# Altium footprint library Cty1.PcbLib: 869 footprints (part 5 of 55)
Each footprint in its own frame and in the unit in brackets; x right, y up, seen from the top. Pads: shape width x height; smd on the part's side, far side on the other; paste and mask are expansions set on the pad; w line width, h text height; cw(c..) or ccw(c..) is an arc to the next point about the centre after c.
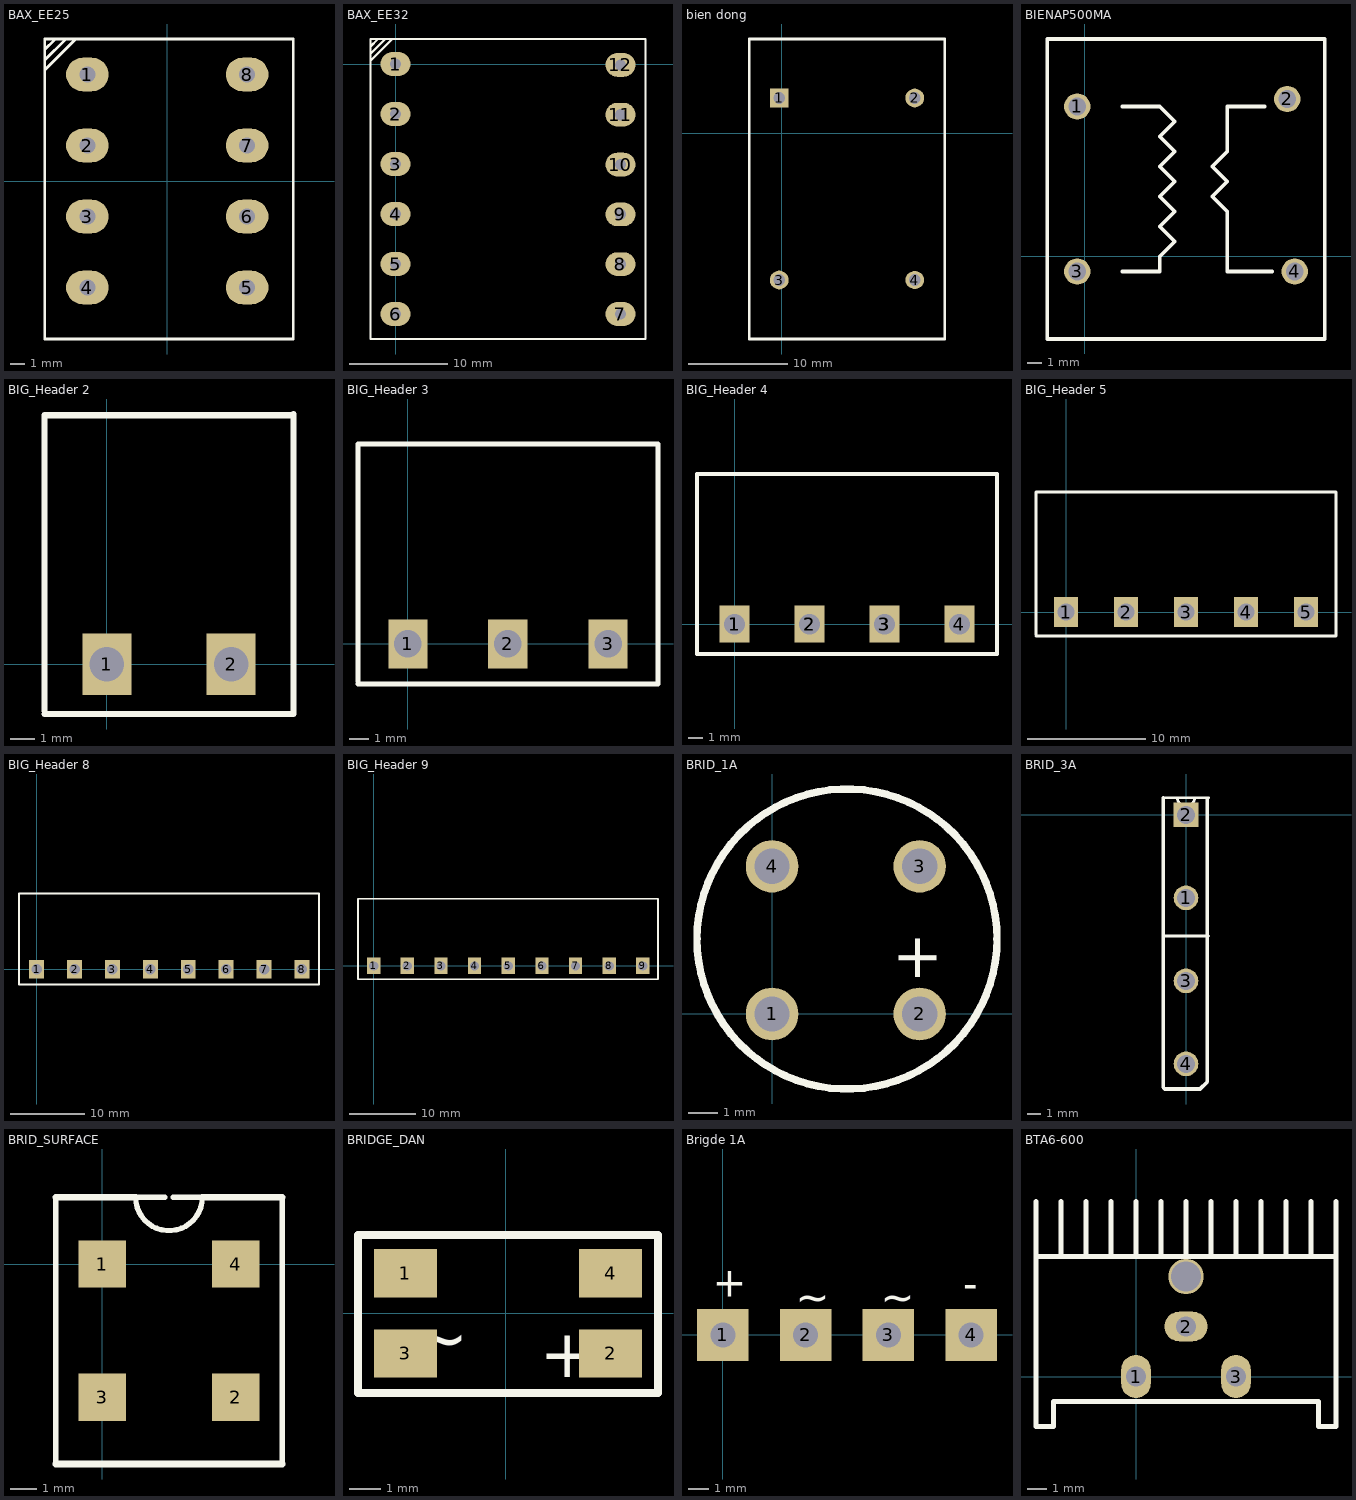
[diagram p4: the footprints below, top view; thin cyan lines are the x and y axes]

## BAX_EE25 [mil] "EE25"
pads (8):
  oval 120x95 hole 45: 1(-225,300) 2(-225,100) 3(-225,-100) 4(-225,-300) 5(225,-300) 6(225,-100) 7(225,100) 8(225,300)
Top Overlay:
  lines w8: -345,313 -259,399 ; -345,339 -345,341 -287,399 ; -345,368 -345,370 -316,399 ; -345,-445 -345,400 355,400 355,-445 -345,-445

## BAX_EE32 [mil] "EE32"
pads (12):
  oval 120x95 hole 45: 1(0,0) 2(0,-200) 3(0,-400) 4(0,-600) 5(0,-800) 6(0,-1000) 7(900,-1000) 8(900,-800.71) 9(900,-601.43) 10(900,-402.14) 11(900,-202.86) 12(900,-3.57)
Top Overlay:
  lines w8: -100,13 -14,99 ; -100,39 -100,41 -42,99 ; -100,68 -100,70 -71,99 ; -100,-1100 -100,100 1000,100 1000,-1100 -100,-1100

## bien dong [mm] "4 pin"
height 100
pads (4):
  rect 1.9x1.9 hole 1.2: 1(-0.254,3.556)
  round 1.9 hole 1.2: 2(13.462,3.556) 3(-0.254,-14.859)
  oval 1.9x1.79 hole 1.2: 4(13.462,-14.859)
Top Overlay:
  lines w0.254: -3.302,-20.828 16.51,-20.828 ; -3.302,-20.828 16.51,-20.828 ; -3.302,-20.828 -3.302,-20.32 -3.302,-19.685 -3.302,9.525 16.51,9.525 16.51,-20.828

## BIENAP500MA [mil]
pads (4):
  round 70 hole 47.24 unplated: 1(-20,400) 2(540,420) 3(-20,-40) 4(560,-40)
Top Overlay:
  lines w10: 100,-40 200,-40 200,0 240,40 200,80 240,120 200,160 240,200 200,240 240,280 200,320 240,360 200,400 100,400 ; 480,400 380,400 380,280 340,240 380,200 340,160 380,120 380,-40 500,-40 ; -100,-220 -100,580 640,580 640,-220 -100,-220

## BIG_Header 2 [mm]
pads (2):
  rect 2x2.5 hole 1.4: 1(0,0) 2(5.08,0)
Top Overlay:
  lines w0.254: -2.54,-2.032 7.62,-2.032 7.62,10.211 ; -2.54,-1.905 -2.54,10.173 ; -2.54,10.16 7.62,10.16
3D body: height 3.15, standoff -9.32, extent -2.5,-1.75 2.5,10.25
3D body: height 3.15, standoff -9.32, extent 2.58,-1.75 7.58,10.25

## BIG_Header 3 [mm]
pads (3):
  rect 2x2.5 hole 1.4: 1(0,0) 2(5.08,0) 3(10.173,0)
Top Overlay:
  lines w0.254: -2.54,-2.032 12.713,-2.032 12.713,10.16 -2.54,10.16 -2.54,-1.905
3D body: height 3.15, standoff -9.32, extent -2.5,-1.75 2.5,10.25
3D body: height 3.15, standoff -9.32, extent 2.593,-1.75 7.593,10.25
3D body: height 3.15, standoff -9.32, extent 7.673,-1.75 12.673,10.25

## BIG_Header 4 [mm]
pads (7):
  rect 2x2.5 hole 1.4: 1(0,0) 1(0,0) 2(5.08,0) 2(5.08,0) 3(10.16,0) 3(10.173,0) 4(15.24,0)
Top Overlay:
  lines w0.254: 12.713,-2.032 -2.54,-2.032 7.62,-2.032 17.78,-2.032 17.78,10.173 -2.527,10.173 -2.54,10.173 -2.54,-1.905 -2.54,10.16 ; 12.713,10.16 -2.54,10.16 ; 17.78,10.16 -2.54,10.16
3D body: height 3.15, standoff -9.32, extent -2.5,-1.75 2.5,10.25
3D body: height 3.15, standoff -9.32, extent 2.58,-1.75 7.58,10.25
3D body: height 3.15, standoff -9.32, extent 7.66,-1.75 12.66,10.25
3D body: height 3.15, standoff -9.32, extent 12.74,-1.75 17.74,10.25

## BIG_Header 5 [mm]
pads (5):
  rect 2x2.5 hole 1.4: 1(0,0) 2(5.08,0) 3(10.16,0) 4(15.24,0) 5(20.32,0)
Top Overlay:
  lines w0.254: -2.54,-2.032 7.62,-2.032 22.86,-2.032 22.86,10.16 ; -2.54,-1.905 -2.54,10.16 ; -2.54,10.16 22.86,10.16 ; -2.54,10.16 6.248,10.16 22.86,10.16
3D body: height 3.15, standoff -9.32, extent -2.5,-1.75 2.5,10.25
3D body: height 3.15, standoff -9.32, extent 2.58,-1.75 7.58,10.25
3D body: height 3.15, standoff -9.32, extent 7.66,-1.75 12.66,10.25
3D body: height 3.15, standoff -9.32, extent 12.74,-1.75 17.74,10.25
3D body: height 3.15, standoff -9.32, extent 17.82,-1.75 22.82,10.25

## BIG_Header 8 [mm]
pads (8):
  rect 2x2.5 hole 1.4: 1(0,0) 2(5.08,0) 3(10.16,0) 4(15.24,0) 5(20.32,0) 6(25.4,0) 7(30.48,0) 8(35.56,0)
Top Overlay:
  lines w0.254: 13.843,10.16 37.846,10.16 37.846,-2.032 27.94,-2.032 17.78,-2.032 7.62,-2.032 -2.362,-2.032 -2.362,10.16 17.78,10.16
3D body: height 3.15, standoff -9.32, extent 33.06,-1.75 38.06,10.25
3D body: height 3.15, standoff -9.32, extent 27.98,-1.75 32.98,10.25
3D body: height 3.15, standoff -9.32, extent 22.9,-1.75 27.9,10.25
3D body: height 3.15, standoff -9.32, extent 17.82,-1.75 22.82,10.25
3D body: height 3.15, standoff -9.32, extent 12.74,-1.75 17.74,10.25
3D body: height 3.15, standoff -9.32, extent 7.66,-1.75 12.66,10.25
3D body: height 3.15, standoff -9.32, extent 2.58,-1.75 7.58,10.25
3D body: height 3.15, standoff -9.32, extent -2.5,-1.75 2.5,10.25

## BIG_Header 9 [mm]
pads (9):
  rect 2x2.5 hole 1.4: 1(0,0) 2(5.08,0) 3(10.16,0) 4(15.24,0) 5(20.32,0) 6(25.4,0) 7(30.48,0) 8(35.56,0) 9(40.64,0)
Top Overlay:
  lines w0.254: 13.843,10.16 42.926,10.16 42.926,-2.032 27.94,-2.032 17.78,-2.032 7.62,-2.032 -2.362,-2.032 -2.362,10.16 17.78,10.16
3D body: height 3.15, standoff -9.32, extent 38.14,-1.75 43.14,10.25
3D body: height 3.15, standoff -9.32, extent 33.06,-1.75 38.06,10.25
3D body: height 3.15, standoff -9.32, extent 27.98,-1.75 32.98,10.25
3D body: height 3.15, standoff -9.32, extent 22.9,-1.75 27.9,10.25
3D body: height 3.15, standoff -9.32, extent 17.82,-1.75 22.82,10.25
3D body: height 3.15, standoff -9.32, extent 12.74,-1.75 17.74,10.25
3D body: height 3.15, standoff -9.32, extent 7.66,-1.75 12.66,10.25
3D body: height 3.15, standoff -9.32, extent 2.58,-1.75 7.58,10.25
3D body: height 3.15, standoff -9.32, extent -2.5,-1.75 2.5,10.25

## BRID_1A [mil]
pads (4):
  round 70 hole 47.24 unplated: 1(0,0) 2(196.85,0) 3(196.85,196.85) 4(0,196.85)
Top Overlay:
  circle w10: c100,100 r200
  text "+" at 220,40 h60

## BRID_3A [mil]
pads (4):
  round 70 hole 51.18 unplated: 1(0,-236.22) 3(0,-472.44) 4(0,-708.66)
  rect 70x70 hole 51.18 unplated: 2(0,0)
Top Overlay:
  lines w7.87: -64.37,-344.49 64.37,-344.49 ; -64.37,49.21 24.61,49.21 cw(c0,49.21) -24.61,49.21 64.37,49.21
  lines w10: -64.37,49.21 -64.37,-775.63 -60,-780 40,-780 60,-760 60,44.84

## BRID_SURFACE [mil]
pads (4):
  rect 70x70 smd: 1(0,0) 2(196.85,-196.85) 3(0,-196.85) 4(196.85,0)
Top Overlay:
  lines w7.87: -68.9,-295.28 -68.9,98.43 ; 91.93,98.43 49.21,98.43 ccw(c98.43,98.43) 147.64,98.43 104.92,98.43 ; 265.75,-295.28 265.75,98.43
  lines w10: -68.9,-295.28 265.75,-295.28 ; -68.9,98.43 49.21,98.43 ; 147.64,98.43 265.75,98.43

## BRIDGE_DAN [mm]
pads (4):
  rect 2x1.524 smd: 1(-3.175,1.27) 2(3.325,-1.27) 3(-3.175,-1.27) 4(3.325,1.27)
Top Overlay:
  lines w0.254: -4.675,-2.52 -4.675,2.48 4.825,2.48 4.825,-2.52 -4.675,-2.52
  text "~" at -2.925,-1.52 h1.52
  text "+" at 1.075,-2.02 h1.52

## Brigde 1A [mm]
pads (4):
  rect 2.5x2.5 / inner round 1.575 / far side rect 2.5x2.5 hole 1.2: 1(0,0) 2(4,0) 3(8,0) 4(12,0)
Top Overlay:
  text "-" at 11.608,1.778 h1.43
  text "+" at -0.483,1.841 h1.43
  text "~" at 7.62,1.13 h1.43
  text "~" at 3.531,1.118 h1.43
3D body: height 10.7, standoff -13.5, extent -1.27,-2.515 13.309,2.495

## BTA6-600 [mm] "TRIAC BTA6/6A/600V"
pads (4):
  oval 1.5x2.2 hole 1: 1(0,0) 3(5.08,0)
  oval 2.2x1.5 hole 1: 2(2.54,2.54)
  round 1.8 hole 1.5: ""(2.54,5.08)
Top Overlay:
  lines w0.254: -5.08,6.096 10.16,6.096 ; -5.08,8.89 -5.08,-2.54 -4.191,-2.54 -4.191,-1.27 9.271,-1.27 9.271,-2.54 10.16,-2.54 10.16,8.89 ; -3.81,6.096 -3.81,8.89 ; -2.54,6.096 -2.54,8.89 ; -1.27,6.096 -1.27,8.89 ; 0,6.096 0,8.89 ; 1.27,6.096 1.27,8.89 ; 2.54,6.096 2.54,8.89 ; 3.81,6.096 3.81,8.89 ; 5.08,6.096 5.08,8.89 ; 6.35,6.096 6.35,8.89 ; 7.62,6.096 7.62,8.89 ; 8.89,6.096 8.89,8.89
3D body: height 20, standoff 0, extent -5.96,2.54 11.04,12.54
3D body: height 18.7, standoff -10.08, extent -2.41,-2.083 7.49,2.417